# Altium footprint library mastermind.PCBLIB: 1061 footprints (part 37 of 67)
Each footprint in its own frame and in the unit in brackets; x right, y up, seen from the top. Pads: shape width x height; smd on the part's side, far side on the other; paste and mask are expansions set on the pad; w line width, h text height; cw(c..) or ccw(c..) is an arc to the next point about the centre after c.
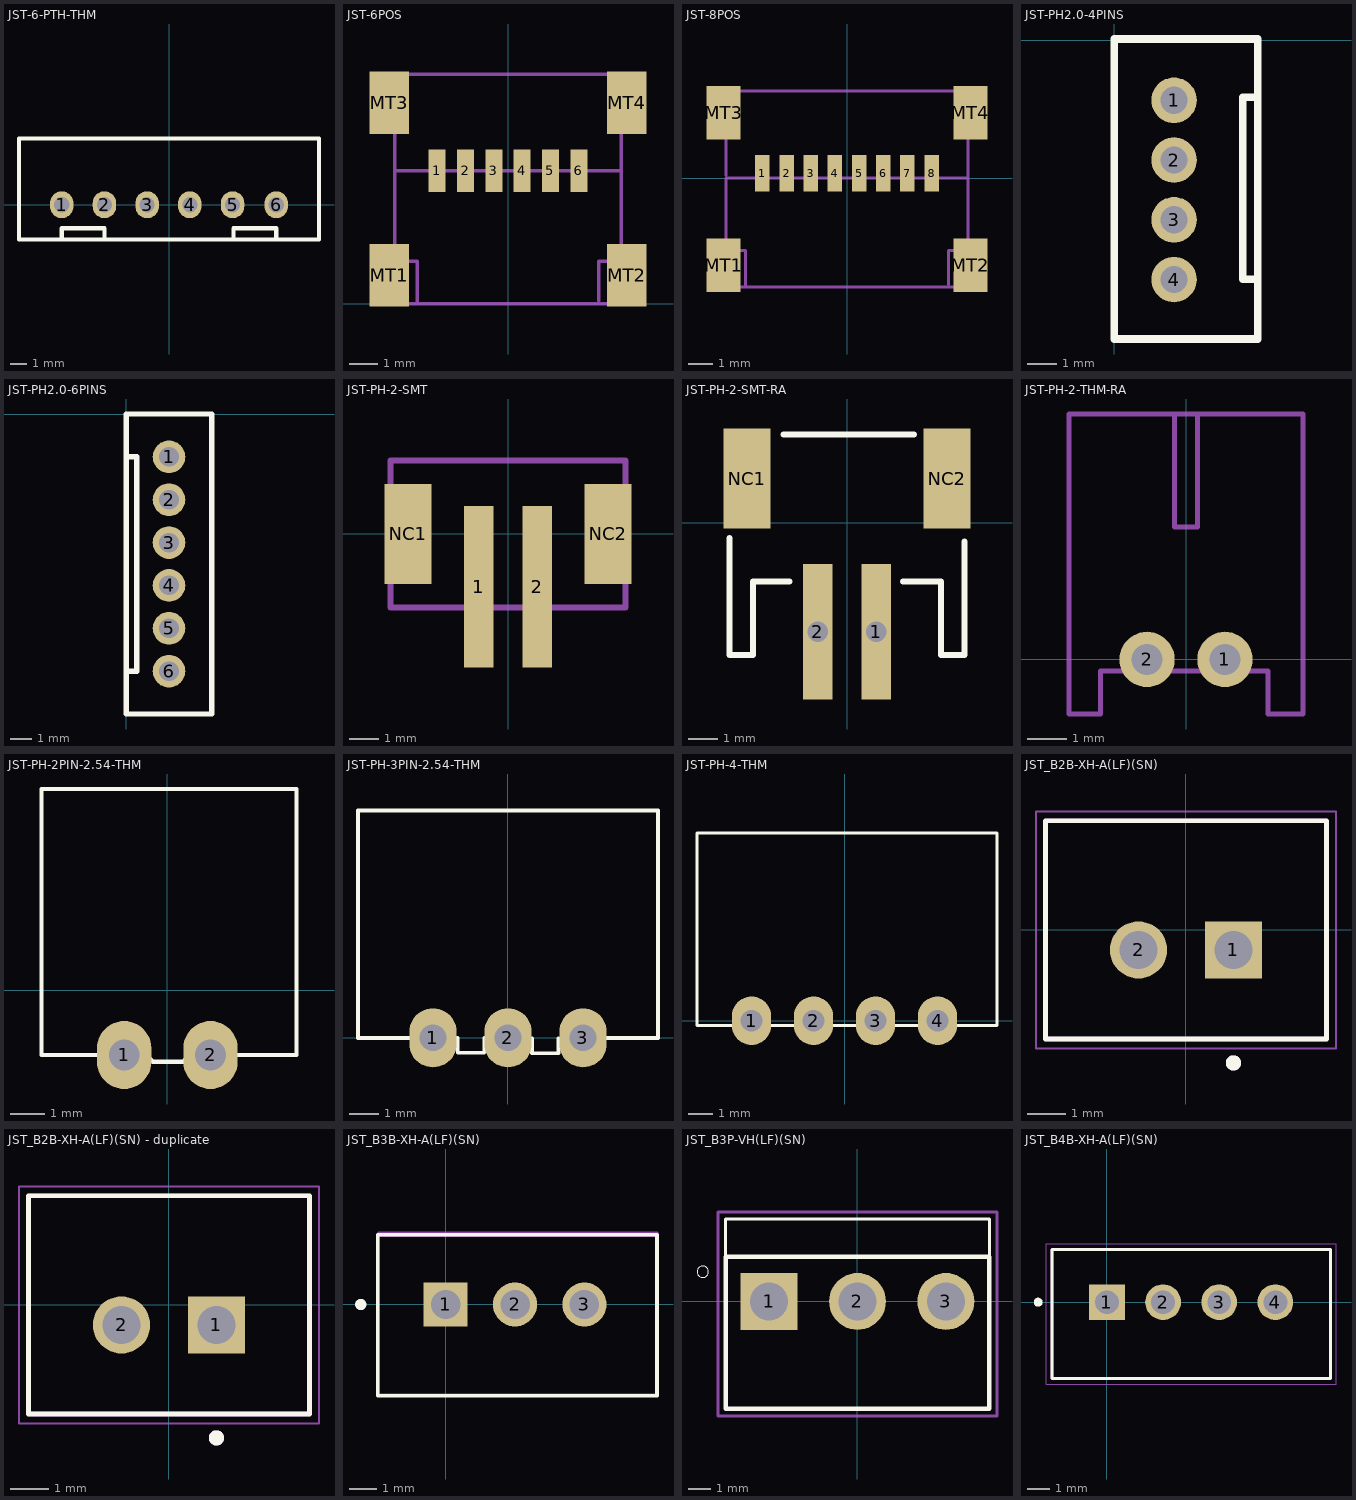
[diagram p36: the footprints below, top view; thin cyan lines are the x and y axes]

## JST-6-PTH-THM [mm]
pads (6):
  oval 1.4x1.6 hole 0.9: 1(-6.38,0) 2(-3.84,0) 3(-1.3,0) 4(1.24,0) 5(3.78,0) 6(6.38,0)
Top Overlay:
  lines w0.254: -8.92,-0.2 -8.92,3.937 -7.493,3.937 7.507,3.937 8.92,3.937 8.92,0 8.92,-2.063 7.507,-2.063 -7.493,-2.063 -8.92,-2.063 -8.92,-0.1 ; -6.38,-2.063 -6.38,-1.397 -3.84,-1.397 -3.84,-2.063 ; 3.84,-2.063 3.84,-1.397 6.38,-1.397 6.38,-2.063

## JST-6POS [mm]
pads (10):
  rect 0.6x1.5 smd: 1(-2.5,4.7) 2(-1.5,4.7) 3(-0.5,4.7) 4(0.5,4.7) 5(1.5,4.7) 6(2.5,4.7)
  rect 1.4x2.2 smd: MT1(-4.2,1) MT2(4.2,1) MT3(-4.2,7.1) MT4(4.2,7.1)
Mechanical 2:
  lines w0.127: 3.2,0.1 3.2,1.5 4,1.5 ; -4,1.5 -3.2,1.5 -3.2,0 ; -4,1.5 -4,4.7 ; -4,1.5 -4,0 -3.2,0 ; -4,4.7 -4,8.1 4,8.1 4,4.7 ; -4,4.7 4,4.7 ; -3.2,0 4,0 4,1.5 ; 4,1.5 4,4.7

## JST-8POS [mm]
pads (12):
  rect 0.6x1.5 smd: 1(-3.5,0.2) 2(-2.5,0.2) 3(-1.5,0.2) 4(-0.5,0.2) 5(0.5,0.2) 6(1.5,0.2) 7(2.5,0.2) 8(3.5,0.2)
  rect 1.4x2.2 smd: MT1(-5.1,-3.6) MT2(5.1,-3.6) MT3(-5.1,2.7) MT4(5.1,2.7)
Mechanical 2:
  lines w0.127: -5,0.1 -5,3.6 5,3.6 5,0 ; 4.2,-4.4 4.2,-3 5,-3 ; -5,-3 -4.2,-3 -4.2,-4.5 ; -5,-3 -5,0 5,0 ; -5,-3 -5,-4.5 -4.2,-4.5 ; -4.2,-4.5 5,-4.5 5,-3 ; 5,-3 5,0

## JST-PH2.0-4PINS [mil]
pads (4):
  round 60 hole 36 paste-99999 mask+2: 1(78.74,-78.74) 2(78.74,-157.48) 3(78.74,-236.22) 4(78.74,-314.96)
Top Overlay:
  lines w10: 188.98,-314.57 169.29,-314.57 169.29,-74.92 188.98,-74.92 ; 0,-393.31 0,1.97 188.98,1.97 188.98,-393.31 0,-393.31
3D body "B4B-PH-K-S.step": height 236.22, standoff -133.86, extent 1.97,-385.83 187.01,3.94

## JST-PH2.0-6PINS [mil]
pads (6):
  round 60 hole 36 paste-99999 mask+2: 1(78.74,-78.74) 2(78.74,-157.48) 3(78.74,-236.22) 4(78.74,-314.96) 5(78.74,-393.7) 6(78.74,-472.44)
Top Overlay:
  lines w10: 0,-472.44 19.68,-472.44 19.68,-78.74 0,-78.74 ; 0,-551.18 0,0 157.48,0 157.48,-551.18 0,-551.18

## JST-PH-2-SMT [mm]
pads (4):
  rect 1x5.5 smd: 1(-1,-1.8) 2(1,-1.8)
  rect 1.6x3.4 smd: NC1(-3.4,0) NC2(3.4,0)
Mechanical 2:
  lines w0.127: -4,-0.5 -4,-2.5 -1.75,-2.5 ; -2.25,2.5 2.25,2.5 ; 1.75,-2.5 4,-2.5 4,-0.5
Mechanical 8:
  lines w0.203: -4,-2.5 4,-2.5 4,2.5 -4,2.5 -4,-2.5

## JST-PH-2-SMT-RA [mm]
pads (4):
  rect 1x4.6 smd: 1(1,-3.7) 2(-1,-3.7)
  rect 1.6x3.4 smd: NC1(-3.4,1.5) NC2(3.4,1.5)
via 1,-3.7 diameter 1 hole 0.7
via -1,-3.7 diameter 1 hole 0.7
Top Overlay:
  lines w0.127: -4,-0.508 -4,-4.5 -3.15,-4.5 -3.15,-2 ; -2.159,3 2.25,3 ; 1.905,-2 3.15,-2 3.15,-4.5 4,-4.5 4,-0.635
  lines w0.203: -4,-0.508 -4,-4.5 -3.2,-4.5 -3.2,-2 -1.955,-2 ; -2.159,3 2.286,3 ; 1.905,-2 3.2,-2 3.2,-4.5 4,-4.5 4,-0.635
3D body "User Library-S2B-PH-SM4-TB.step": height 5.5, standoff -0.1, extent -3.95,-5.461 3.95,3.139

## JST-PH-2-THM-RA [mil]
pads (2):
  round 56 hole 31.5: 1(39.37,0) 2(-39.37,0)
Mechanical 2:
  lines w5: -86.61,-55.12 -86.61,-11.81 82.68,-11.81 82.68,-55.12 86.61,-55.12 ; -11.81,248.03 -11.81,133.86 11.81,133.86 11.81,248.03
Mechanical 8:
  lines w5: -86.61,-55.12 -118.11,-55.12 -118.11,248.03 118.11,248.03 118.11,-55.12 86.61,-55.12

## JST-PH-2PIN-2.54-THM [mm]
pads (2):
  oval 1.6x2 hole 0.9: 1(-1.27,-1.9) 2(1.27,-1.9)
Top Overlay:
  lines w0.127: -3.7,-1.9 -0.63,-1.9 -0.43,-2.1 0.47,-2.1 0.67,-1.9 3.8,-1.9 3.8,5.918 -3.7,5.918 -3.7,-1.9
3D body "JST - XH - Thru (R) - 2Pin - 2.54mm.stp": height 5.84, standoff -3.38, extent -3.6,-2.118 3.614,5.918

## JST-PH-3PIN-2.54-THM [mm]
pads (3):
  oval 1.6x2 hole 0.9: 1(-2.54,0) 2(0,0) 3(2.54,0)
Top Overlay:
  lines w0.127: -0.8,0 -0.8,-0.5 -1.7,-0.5 -1.7,0 -5.08,0 -5.08,7.7 5.08,7.7 5.08,0 3.34,0 ; 0.814,-0.021 0.814,-0.521 1.714,-0.521 1.714,-0.021
3D body "JST - XH - Thru (R) - 3Pin - 2.54mm.stp": height 5.84, standoff -3.38, extent -4.877,-0.203 4.877,7.834

## JST-PH-4-THM [mm]
pads (4):
  oval 1.6x2 hole 0.9: 1(-3.81,0) 2(-1.27,0) 3(1.27,0) 4(3.81,0)
Top Overlay:
  lines w0.127: -6.047,-0.203 6.247,-0.203 6.247,7.7 -6.047,7.7 -6.047,-0.203
3D body "JST - XH - Thru (R) - 4Pin - 2.54mm.stp": height 5.84, standoff -3.38, extent -6.047,-0.203 6.247,7.834

## JST_B2B-XH-A(LF)(SN) [mm]
pads (2):
  rect 1.508x1.508 hole 1: 1(1.25,-0.525)
  round 1.508 hole 1: 2(-1.25,-0.525)
Top Overlay:
  circle w0.2: c1.25,-3.5 r0.1
  lines w0.127: -3.7,-2.875 -3.7,2.875 3.7,2.875 3.7,-2.875 -3.7,-2.875
Mechanical 13:
  circle w0.2: c1.25,-3.5 r0.1
  lines w0.127: -3.7,-2.875 -3.7,2.875 3.7,2.875 3.7,-2.875 -3.7,-2.875
Mechanical 15:
  lines w0.05: -3.95,-3.125 -3.95,3.125 3.95,3.125 3.95,-3.125 -3.95,-3.125
3D body "step_temp.STEP": height 7, standoff -3.4, extent -3.7,-2.858 3.7,2.892

## JST_B2B-XH-A(LF)(SN) - duplicate [mm]
pads (2):
  rect 1.508x1.508 hole 1: 1(1.25,-0.525)
  round 1.508 hole 1: 2(-1.25,-0.525)
Top Overlay:
  circle w0.2: c1.25,-3.5 r0.1
  lines w0.127: -3.7,-2.875 3.7,-2.875 3.7,2.875 -3.7,2.875 -3.7,-2.875
Mechanical 13:
  circle w0.2: c1.25,-3.5 r0.1
  lines w0.127: -3.7,-2.875 3.7,-2.875 3.7,2.875 -3.7,2.875 -3.7,-2.875
Mechanical 15:
  lines w0.05: -3.95,-3.125 3.95,-3.125 3.95,3.125 -3.95,3.125 -3.95,-3.125
3D body "step_temp.STEP": height 7, standoff -3.4, extent -3.7,-2.858 3.7,2.892

## JST_B3B-XH-A(LF)(SN) [mm]
pads (3):
  rect 1.59x1.59 hole 1.06: 1(0,0)
  round 1.59 hole 1.06: 2(2.5,0) 3(5,0)
Top Overlay:
  circle w0.2: c-3.06,0 r0.1
  lines w0.127: -2.45,-3.288 -2.45,2.511 7.615,2.511 7.615,-3.288 -2.45,-3.288
Mechanical 13:
  lines w0.127: -2.45,-3.276 -2.45,2.503 7.615,2.503 7.615,-3.276 -2.45,-3.276
Mechanical 15:
  lines w0.05: -2.432,-3.27 -2.432,2.6 7.651,2.6 7.651,-3.27 -2.432,-3.27
3D body "JST 2.54X3P.step": height 7, standoff -3, extent -2.465,-3.25 7.615,2.45

## JST_B3P-VH(LF)(SN) [mm]
pads (3):
  rect 2.55x2.55 hole 1.7: 1(-3.96,0)
  round 2.55 hole 1.7: 2(0,0) 3(3.96,0)
Top Overlay:
  circle w0: c-6.935,1.33 r0.254
  lines w0.127: -5.91,2 -5.91,3.7 5.91,3.7 5.91,2
  lines w0.203: -5.91,-4.8 -5.91,2 5.91,2 5.91,-4.8 -5.91,-4.8
Mechanical 15:
  lines w0.127: -6.25,-5.125 6.25,-5.125 6.25,4 -6.25,4 -6.25,-5.125
3D body "B3P-VH(LF)(SN)--3DModel-STEP-1.STEP": height 11.45, standoff -3.15, extent -5.961,-4.479 5.859,4.021

## JST_B4B-XH-A(LF)(SN) [mm]
pads (4):
  rect 1.59x1.59 hole 1.06: 1(0,0)
  round 1.59 hole 1.06: 2(2.5,0) 3(5,0) 4(7.5,0)
Top Overlay:
  circle w0.2: c-3.06,0 r0.1
  lines w0.127: -2.45,-3.4 -2.45,2.35 9.95,2.35 9.95,-3.4 -2.45,-3.4
Mechanical 13:
  lines w0.127: -2.45,-3.4 -2.45,2.35 9.95,2.35 9.95,-3.4 -2.45,-3.4
Mechanical 15:
  lines w0.05: -2.7,-3.65 -2.7,2.6 10.2,2.6 10.2,-3.65 -2.7,-3.65
3D body "step_temp.STEP": height 7, standoff -3.4, extent -2.45,-3.4 9.95,2.35